# Altium footprint library Miscellaneous Devices LC.PcbLib: 776 footprints (part 15 of 49)
Each footprint in its own frame and in the unit in brackets; x right, y up, seen from the top. Pads: shape width x height; smd on the part's side, far side on the other; paste and mask are expansions set on the pad; w line width, h text height; cw(c..) or ccw(c..) is an arc to the next point about the centre after c.
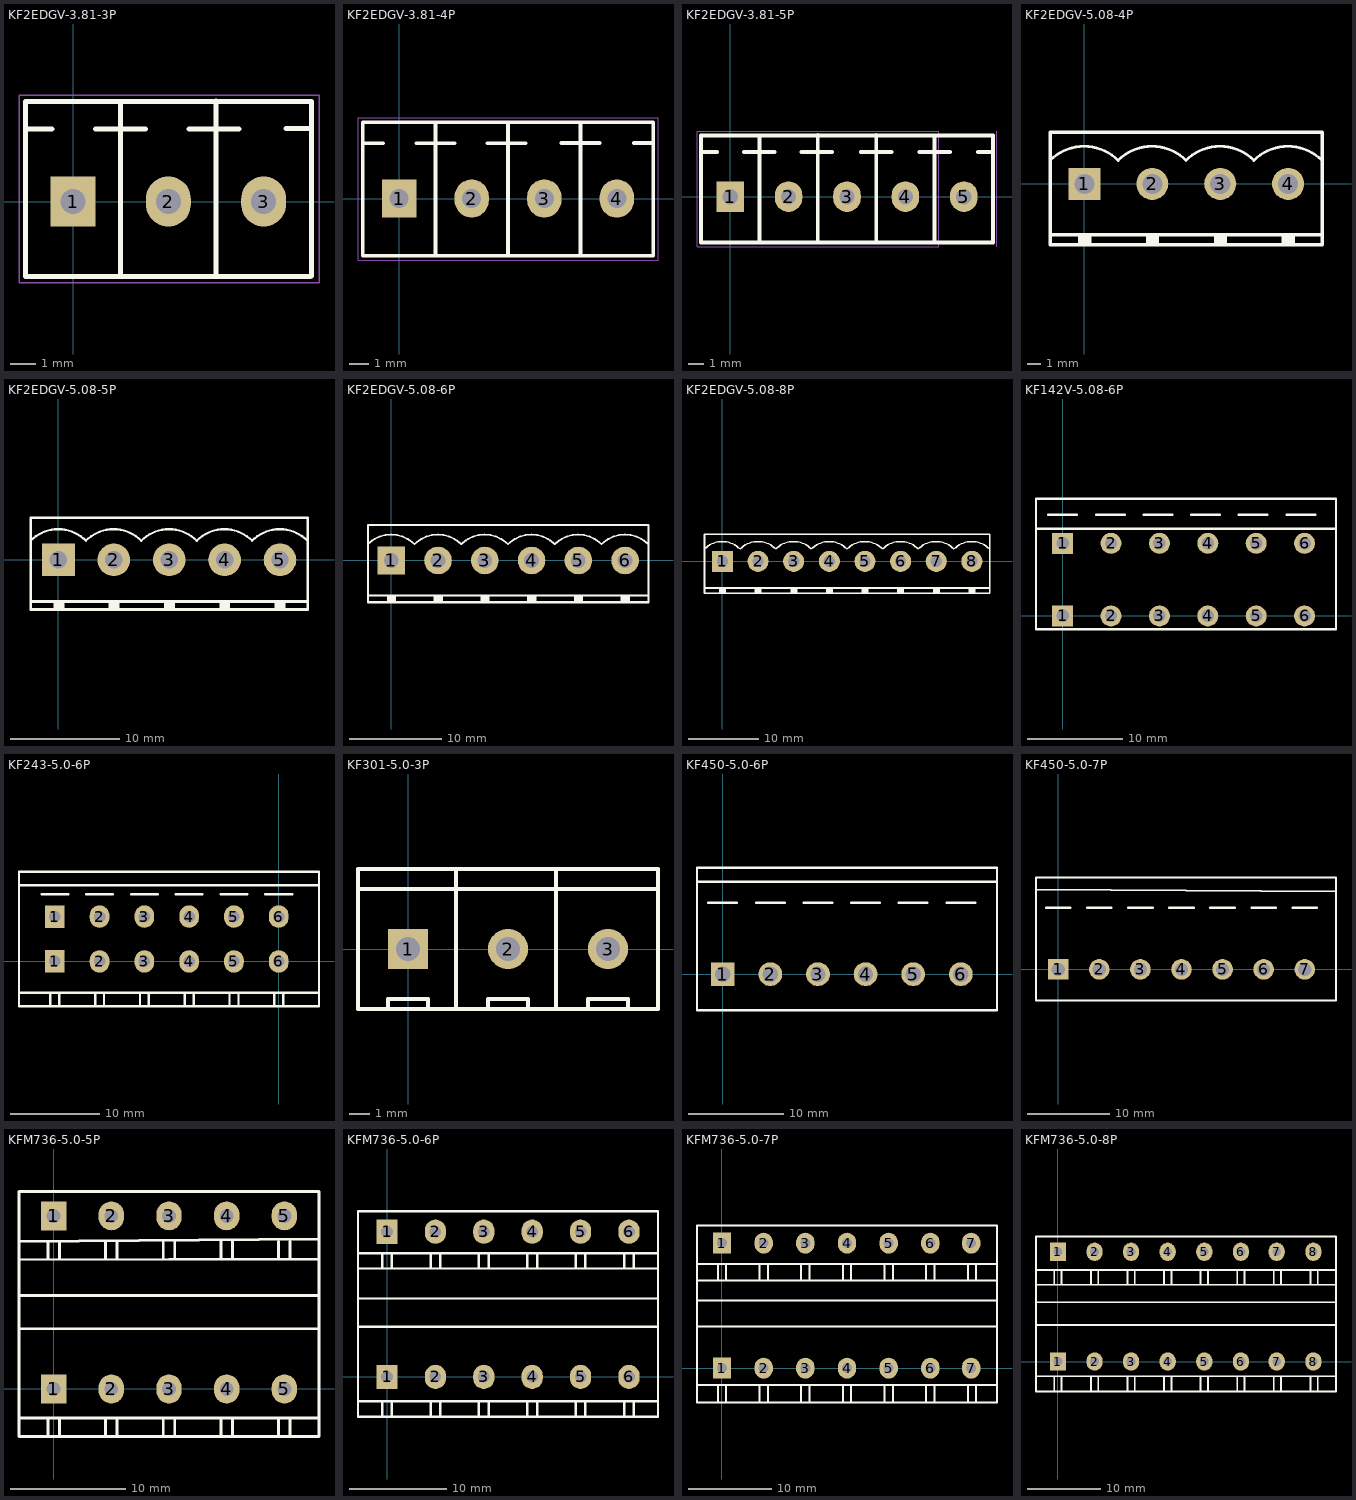
[diagram p14: the footprints below, top view; thin cyan lines are the x and y axes]

## KF2EDGV-3.81-3P [mm]
pads (3):
  rect 1.8x2 hole 1: 1(0,0)
  oval 1.8x2 hole 1: 2(3.81,0) 3(7.62,0)
Top Overlay:
  lines w0.2: -1.841,2.9 -0.841,2.9 ; 0.9,2.9 2.9,2.9 ; 1.905,-3 1.905,4 ; 4.641,2.9 6.641,2.9 ; 5.715,-2.992 5.715,4.008 ; 8.52,2.921 9.525,2.921 ; -1.905,-3 -1.905,4 9.525,4 9.525,-2.972 9.497,-3 -1.905,-3
Mechanical 15:
  lines w0.1: -1.905,-3 -1.905,4 9.437,4 9.5,3.937 9.5,-3 -1.905,-3
Mechanical 20:
  lines w0.05: -2.159,-3.25 9.83,-3.25 9.83,4.25 -2.159,4.25 -2.159,-3.25

## KF2EDGV-3.81-4P [mm]
pads (4):
  rect 1.8x2 hole 1: 1(0,0)
  oval 1.8x2 hole 1: 2(3.81,0) 3(7.62,0) 4(11.43,0)
Top Overlay:
  lines w0.2: -1.841,2.9 -0.841,2.9 ; 0.9,2.9 2.9,2.9 ; 1.905,-3 1.905,4 ; 4.641,2.9 6.641,2.9 ; 5.715,-2.992 5.715,4.008 ; 8.52,2.921 10.52,2.921 ; 9.525,-2.992 9.525,4.008 ; 12.335,2.921 13.335,2.921 ; -1.905,-3 -1.905,4 13.335,4 13.335,-3 -1.905,-3
Mechanical 15:
  lines w0.1: -1.905,-3 13.335,-3 13.335,4 -1.905,4 -1.905,-3
Mechanical 20:
  lines w0.05: -2.159,-3.25 13.589,-3.25 13.589,4.25 -2.159,4.25 -2.159,-3.25

## KF2EDGV-3.81-5P [mm]
pads (5):
  rect 1.8x2 hole 1: 1(0,0)
  oval 1.8x2 hole 1: 2(3.81,0) 3(7.62,0) 4(11.43,0) 5(15.24,0)
Top Overlay:
  lines w0.254: -1.841,2.9 -0.841,2.9 ; 0.9,2.9 2.9,2.9 ; 1.905,-3 1.905,4 ; 4.641,2.9 6.641,2.9 ; 5.715,-2.992 5.715,4.008 ; 8.52,2.921 10.52,2.921 ; 9.525,-2.992 9.525,4.008 ; 12.262,4 17.145,4 17.145,-3 12.554,-3 ; 12.33,2.921 14.33,2.921 ; 12.335,2.921 13.335,2.921 ; 16.145,2.921 17.145,2.921 ; -1.905,-3 -1.905,4 13.335,4 13.335,-3 -1.905,-3
Mechanical 15:
  lines w0.1: 17.145,-3 17.145,4 ; -1.905,-3 13.335,-3 13.335,4 -1.905,4 -1.905,-3
Mechanical 20:
  lines w0.05: 17.399,-3.25 17.399,4.25 ; -2.159,-3.25 13.589,-3.25 13.589,4.25 -2.159,4.25 -2.159,-3.25

## KF2EDGV-5.08-4P [mm]
height 1.524
pads (4):
  rect 2.4x2.4 hole 1.5: 1(0,0)
  round 2.4 hole 1.5: 2(5.08,0) 3(10.16,0) 4(15.24,0)
Top Overlay:
  rectangle: 14.756,-4.614 15.756,-3.814
  rectangle: 9.676,-4.614 10.676,-3.814
  rectangle: 4.596,-4.614 5.596,-3.814
  rectangle: -0.465,-4.614 0.535,-3.814
  lines w0.203: -2.564,1.757 cw(c-0.02,-0.787) 2.524,1.757 ; 2.516,1.757 cw(c5.06,-0.787) 7.604,1.757 ; 7.596,1.757 cw(c10.14,-0.787) 12.684,1.757 ; 12.676,1.757 cw(c15.22,-0.787) 17.764,1.757
  lines w0.254: -2.54,-3.81 17.78,-3.81 ; -2.54,-4.55 17.78,-4.55 17.78,3.85 -2.54,3.85 -2.54,-4.55

## KF2EDGV-5.08-5P [mm]
height 1.524
pads (5):
  rect 3x3 hole 1.6: 1(0,0)
  round 3 hole 1.6: 2(5.08,0) 3(10.16,0) 4(15.24,0) 5(20.32,0)
Top Overlay:
  rectangle: -0.465,-4.614 0.535,-3.814
  rectangle: 4.596,-4.614 5.596,-3.814
  rectangle: 9.676,-4.614 10.676,-3.814
  rectangle: 14.756,-4.614 15.756,-3.814
  rectangle: 19.836,-4.614 20.836,-3.814
  lines w0.203: -2.564,1.757 cw(c-0.02,-0.787) 2.524,1.757 ; 2.516,1.757 cw(c5.06,-0.787) 7.604,1.757 ; 7.596,1.757 cw(c10.14,-0.787) 12.684,1.757 ; 12.676,1.757 cw(c15.22,-0.787) 17.764,1.757 ; 17.756,1.757 cw(c20.3,-0.787) 22.844,1.757
  lines w0.254: -2.54,-3.81 22.86,-3.81 ; -2.54,-4.55 -2.54,3.85 22.86,3.85 22.86,-4.55 -2.54,-4.55

## KF2EDGV-5.08-6P [mm]
height 1.524
pads (6):
  rect 3x3 hole 1.6: 1(0,0)
  round 3 hole 1.6: 2(5.08,0) 3(10.16,0) 4(15.24,0) 5(20.32,0) 6(25.4,0)
Top Overlay:
  rectangle: 24.918,-4.614 25.918,-3.814
  rectangle: -0.465,-4.614 0.535,-3.814
  rectangle: 4.596,-4.614 5.596,-3.814
  rectangle: 9.676,-4.614 10.676,-3.814
  rectangle: 14.756,-4.614 15.756,-3.814
  rectangle: 19.836,-4.614 20.836,-3.814
  lines w0.203: -2.564,1.757 cw(c-0.02,-0.787) 2.524,1.757 ; 2.516,1.757 cw(c5.06,-0.787) 7.604,1.757 ; 7.596,1.757 cw(c10.14,-0.787) 12.684,1.757 ; 12.676,1.757 cw(c15.22,-0.787) 17.764,1.757 ; 17.756,1.757 cw(c20.3,-0.787) 22.844,1.757 ; 22.836,1.757 cw(c25.38,-0.787) 27.924,1.757
  lines w0.254: -2.54,-3.81 27.94,-3.81 ; -2.54,-4.55 -2.54,3.85 27.94,3.85 27.94,-4.55 -2.54,-4.55

## KF2EDGV-5.08-8P [mm]
height 1.524
pads (8):
  rect 3x3 hole 1.6: 1(0,0)
  round 3 hole 1.6: 2(5.08,0) 3(10.16,0) 4(15.24,0) 5(20.32,0) 6(25.4,0) 7(30.48,0) 8(35.56,0)
Top Overlay:
  rectangle: 29.996,-4.614 30.996,-3.814
  rectangle: 35.078,-4.614 36.078,-3.814
  rectangle: 24.918,-4.614 25.918,-3.814
  rectangle: -0.465,-4.614 0.535,-3.814
  rectangle: 4.596,-4.614 5.596,-3.814
  rectangle: 9.676,-4.614 10.676,-3.814
  rectangle: 14.756,-4.614 15.756,-3.814
  rectangle: 19.836,-4.614 20.836,-3.814
  lines w0.203: -2.564,1.757 cw(c-0.02,-0.787) 2.524,1.757 ; 2.516,1.757 cw(c5.06,-0.787) 7.604,1.757 ; 7.596,1.757 cw(c10.14,-0.787) 12.684,1.757 ; 12.676,1.757 cw(c15.22,-0.787) 17.764,1.757 ; 17.756,1.757 cw(c20.3,-0.787) 22.844,1.757 ; 22.836,1.757 cw(c25.38,-0.787) 27.924,1.757 ; 27.916,1.757 cw(c30.46,-0.787) 33.004,1.757 ; 32.996,1.757 cw(c35.54,-0.787) 38.084,1.757
  lines w0.254: -2.54,-3.81 38.1,-3.81 ; -2.54,-4.55 38.1,-4.55 38.1,3.85 -2.54,3.85 -2.54,-4.55

## KF142V-5.08-6P [mm]
pads (12):
  rect 2.2x2.2 hole 1.3: 1(0,0) 1(0,7.62)
  round 2.2 hole 1.3: 2(5.08,0) 2(5.08,7.62) 3(10.16,0) 3(10.16,7.62) 4(15.24,0) 4(15.24,7.62) 5(20.32,0) 5(20.32,7.62) 6(25.4,0) 6(25.4,7.62)
Top Overlay:
  lines w0.254: -2.8,9.17 28.7,9.17 ; -1.5,10.62 1.5,10.62 ; 3.5,10.62 6.5,10.62 ; 8.5,10.62 11.5,10.62 ; 13.5,10.62 16.5,10.62 ; 18.5,10.62 21.5,10.62 ; 23.5,10.62 26.5,10.62 ; -2.8,-1.4 -2.8,12.3 28.7,12.3 28.7,-1.4 -2.8,-1.4

## KF243-5.0-6P [mm]
pads (12):
  rect 2.2x2.5 hole 1.3: 1(-25,0) 1(-25,5)
  oval 2.2x2.5 hole 1.3: 2(-20,0) 2(-20,5) 3(-15,0) 3(-15,5) 4(-10,0) 4(-10,5) 5(-5,0) 5(-5,5) 6(0,0) 6(0,5)
Top Overlay:
  lines w0.254: -29,-3.5 4.5,-3.5 ; -29,8.5 4.5,8.5 ; -26.5,7.5 -23.5,7.5 ; -25.5,-5 -25.5,-3.5 ; -24.5,-5 -24.5,-3.5 ; -21.5,7.5 -18.5,7.5 ; -20.5,-5 -20.5,-3.5 ; -19.5,-5 -19.5,-3.5 ; -16.5,7.5 -13.5,7.5 ; -15.5,-5 -15.5,-3.5 ; -14.5,-5 -14.5,-3.5 ; -11.5,7.5 -8.5,7.5 ; -10.5,-5 -10.5,-3.5 ; -9.5,-5 -9.5,-3.5 ; -6.5,7.5 -3.5,7.5 ; -5.5,-5 -5.5,-3.5 ; -4.5,-5 -4.5,-3.5 ; -1.5,7.5 1.5,7.5 ; -0.5,-5 -0.5,-3.5 ; 0.5,-5 0.5,-3.5 ; -29,-5 4.5,-5 4.5,10 -29,10 -29,-5

## KF301-5.0-3P [mm]
pads (3):
  rect 2x2 hole 1.2: 1(0,0)
  round 2 hole 1.2: 2(5,0) 3(10,0)
Top Overlay:
  lines w0.2: -2.5,3 12.5,3 ; -1,-3 -1,-2.5 1,-2.5 1,-3 ; 2.405,-3 2.405,4 ; 4,-3 4,-2.5 6,-2.5 6,-3 ; 7.405,-3 7.405,4 ; 9,-3 9,-2.5 11,-2.5 11,-3 ; -2.5,-3 12.5,-3 12.5,4 -2.5,4 -2.5,-3

## KF450-5.0-6P [mm]
pads (6):
  rect 2.5x2.5 hole 1.6: 1(0,0)
  round 2.5 hole 1.6: 2(5,0) 3(10,0) 4(15,0) 5(20,0) 6(25,0)
Top Overlay:
  lines w0.254: -2.7,9.7 28.8,9.7 ; -1.5,7.5 1.5,7.5 ; 3.5,7.5 6.5,7.5 ; 8.5,7.5 11.5,7.5 ; 13.5,7.5 16.5,7.5 ; 18.5,7.5 21.5,7.5 ; 23.5,7.5 26.5,7.5 ; -2.7,-3.8 -2.7,11.2 28.8,11.2 28.8,-3.8 -2.7,-3.8

## KF450-5.0-7P [mm]
pads (7):
  rect 2.5x2.5 hole 1.6: 1(0,0)
  round 2.5 hole 1.6: 2(5,0) 3(10,0) 4(15,0) 5(20,0) 6(25,0) 7(30,0)
Top Overlay:
  lines w0.254: -2.7,9.7 33.8,9.491 ; -1.5,7.5 1.5,7.5 ; 3.5,7.5 6.5,7.5 ; 8.5,7.5 11.5,7.5 ; 13.5,7.5 16.5,7.5 ; 18.5,7.5 21.5,7.5 ; 23.5,7.5 26.5,7.5 ; 28.5,7.5 31.5,7.5 ; -2.7,-3.8 33.8,-3.8 33.8,11.2 -2.7,11.2 -2.7,-3.8

## KFM736-5.0-5P [mm]
pads (10):
  rect 2.2x2.5 hole 1.2: 1(0,0) 1(0,15)
  oval 2.2x2.5 hole 1.2: 2(5,0) 2(5,15) 3(10,0) 3(10,15) 4(15,0) 4(15,15) 5(20,0) 5(20,15)
Top Overlay:
  lines w0.254: -3,-2.5 23,-2.5 ; -3,5.2 23,5.25 ; -3,11.2 23,11.25 ; -3,12.8 23,13 ; -2.9,8.1 23,8.1 ; -0.5,-4 -0.5,-2.5 ; -0.5,11.3 -0.5,12.8 ; 0.5,-4 0.5,-2.5 ; 0.5,11.3 0.5,12.8 ; 4.5,-4 4.5,-2.5 ; 4.5,11.3 4.5,12.8 ; 5.5,-4 5.5,-2.5 ; 5.5,11.3 5.5,12.8 ; 9.5,-4 9.5,-2.5 ; 9.5,11.3 9.5,12.8 ; 10.5,-4 10.5,-2.5 ; 10.5,11.3 10.5,12.8 ; 14.5,-4 14.5,-2.5 ; 14.5,11.3 14.5,12.8 ; 15.5,-4 15.5,-2.5 ; 15.5,11.3 15.5,12.8 ; 19.5,-4 19.5,-2.5 ; 19.5,11.3 19.5,12.8 ; 20.5,-4 20.5,-2.5 ; 20.5,11.3 20.5,12.8 ; -3,-4.1 23,-4.1 23,17.1 -3,17.1 -3,-4.1

## KFM736-5.0-6P [mm]
pads (12):
  rect 2.2x2.5 hole 1.2: 1(0,0) 1(0,15)
  oval 2.2x2.5 hole 1.2: 2(5,0) 2(5,15) 3(10,0) 3(10,15) 4(15,0) 4(15,15) 5(20,0) 5(20,15) 6(25,0) 6(25,15)
Top Overlay:
  lines w0.254: -3,-2.5 28,-2.5 ; -3,5.2 27.9,5.2 ; -3,11.2 28,11.2 ; -3,12.8 28,12.8 ; -2.9,8.1 28,8.1 ; -0.5,-4 -0.5,-2.5 ; -0.5,11.3 -0.5,12.8 ; 0.5,-4 0.5,-2.5 ; 0.5,11.3 0.5,12.8 ; 4.5,-4 4.5,-2.5 ; 4.5,11.3 4.5,12.8 ; 5.5,-4 5.5,-2.5 ; 5.5,11.3 5.5,12.8 ; 9.5,-4 9.5,-2.5 ; 9.5,11.3 9.5,12.8 ; 10.5,-4 10.5,-2.5 ; 10.5,11.3 10.5,12.8 ; 14.5,-4 14.5,-2.5 ; 14.5,11.3 14.5,12.8 ; 15.5,-4 15.5,-2.5 ; 15.5,11.3 15.5,12.8 ; 19.5,-4 19.5,-2.5 ; 19.5,11.3 19.5,12.8 ; 20.5,-4 20.5,-2.5 ; 20.5,11.3 20.5,12.8 ; 24.5,-4 24.5,-2.5 ; 24.5,11.3 24.5,12.8 ; 25.5,-4 25.5,-2.5 ; 25.5,11.3 25.5,12.8 ; -3,-4.1 -3,17.1 28,17.1 28,-4.1 -3,-4.1

## KFM736-5.0-7P [mm]
pads (14):
  rect 2.2x2.5 hole 1.2: 1(0,0) 1(0,15)
  oval 2.2x2.5 hole 1.2: 2(5,0) 2(5,15) 3(10,0) 3(10,15) 4(15,0) 4(15,15) 5(20,0) 5(20,15) 6(25,0) 6(25,15) 7(29.9,0) 7(29.9,15)
Top Overlay:
  lines w0.254: -3,-2 33,-2 ; -3,5 33,5 ; -3,10.5 33,10.5 ; -3,12.5 33,12.5 ; -2.9,8.1 33,8.1 ; -0.5,-4 -0.5,-2 ; -0.5,10.5 -0.5,12.5 ; 0.5,-4 0.5,-2 ; 0.5,10.5 0.5,12.5 ; 4.5,-4 4.5,-2 ; 4.5,10.5 4.5,12.5 ; 5.5,-4 5.5,-2 ; 5.5,10.5 5.5,12.5 ; 9.5,-4 9.5,-2 ; 9.5,10.5 9.5,12.5 ; 10.5,-4 10.5,-2 ; 10.5,10.5 10.5,12.5 ; 14.5,-4 14.5,-2 ; 14.5,10.5 14.5,12.5 ; 15.5,-4 15.5,-2 ; 15.5,10.5 15.5,12.5 ; 19.5,-4 19.5,-2 ; 19.5,10.5 19.5,12.5 ; 20.5,-4 20.5,-2 ; 20.5,10.5 20.5,12.5 ; 24.5,-4 24.5,-2 ; 24.5,10.5 24.5,12.5 ; 25.5,-4 25.5,-2 ; 25.5,10.5 25.5,12.5 ; 29.5,-4 29.5,-2 ; 29.5,10.5 29.5,12.5 ; 30.5,-4 30.5,-2 ; 30.5,10.5 30.5,12.5 ; -3,-4.1 -3,17.1 33,17.1 33,-4.1 -3,-4.1

## KFM736-5.0-8P [mm]
pads (16):
  rect 2.2x2.5 hole 1.2: 1(0,0) 1(0,15)
  oval 2.2x2.5 hole 1.2: 2(5,0) 2(5,15) 3(10,0) 3(10,15) 4(15,0) 4(15,15) 5(20,0) 5(20,15) 6(25,0) 6(25,15) 7(29.9,0) 7(29.9,15) 8(34.9,0) 8(34.9,15)
Top Overlay:
  lines w0.254: -3,-2 38,-2 ; -3,5 38,5 ; -3,8.1 38,8.1 ; -3,10.5 38,10.5 ; -3,12.5 38,12.5 ; -0.5,-4 -0.5,-2 ; -0.5,10.5 -0.5,12.5 ; 0.5,-4 0.5,-2 ; 0.5,10.5 0.5,12.5 ; 4.5,-4 4.5,-2 ; 4.5,10.5 4.5,12.5 ; 5.5,-4 5.5,-2 ; 5.5,10.5 5.5,12.5 ; 9.5,-4 9.5,-2 ; 9.5,10.5 9.5,12.5 ; 10.5,-4 10.5,-2 ; 10.5,10.5 10.5,12.5 ; 14.5,-4 14.5,-2 ; 14.5,10.5 14.5,12.5 ; 15.5,-4 15.5,-2 ; 15.5,10.5 15.5,12.5 ; 19.5,-4 19.5,-2 ; 19.5,10.5 19.5,12.5 ; 20.5,-4 20.5,-2 ; 20.5,10.5 20.5,12.5 ; 24.5,-4 24.5,-2 ; 24.5,10.5 24.5,12.5 ; 25.5,-4 25.5,-2 ; 25.5,10.5 25.5,12.5 ; 29.5,-4 29.5,-2 ; 29.5,10.5 29.5,12.5 ; 30.5,-4 30.5,-2 ; 30.5,10.5 30.5,12.5 ; 34.5,-4 34.5,-2 ; 34.5,10.5 34.5,12.5 ; 35.5,-4 35.5,-2 ; 35.5,10.5 35.5,12.5 ; -3,-4.1 -3,17.1 38,17.1 38,-4.1 -3,-4.1